# Altium footprint library EG4S20BG256.PcbLib: 33 footprints (part 1 of 3)
Each footprint in its own frame and in the unit in brackets; x right, y up, seen from the top. Pads: shape width x height; smd on the part's side, far side on the other; paste and mask are expansions set on the pad; w line width, h text height; cw(c..) or ccw(c..) is an arc to the next point about the centre after c.
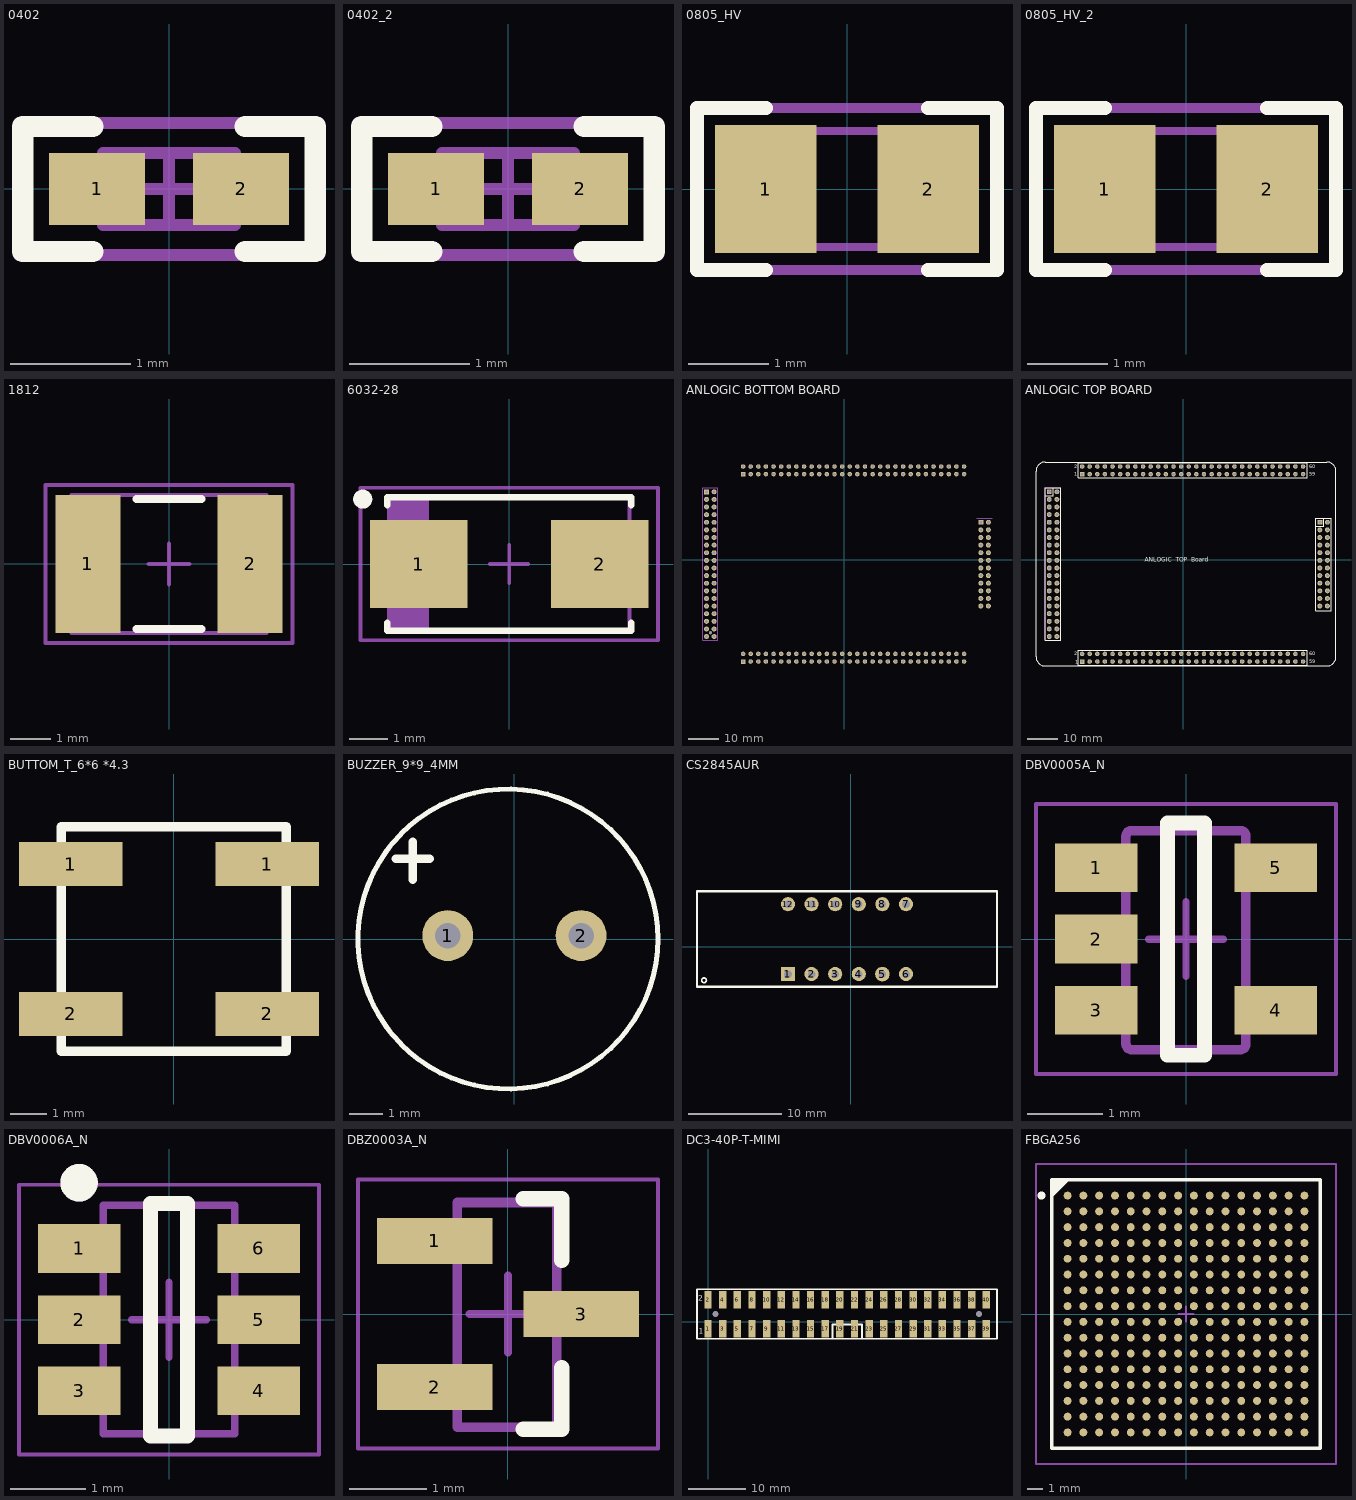
[diagram p0: the footprints below, top view; thin cyan lines are the x and y axes]

## 0402 [mm] "0402 from SM-752 data"
height 0.6
pads (2):
  rect 0.8x0.6 smd: 1(-0.6,0) 2(0.6,0)
Top Overlay:
  lines w0.178: -0.635,-0.521 -1.219,-0.521 -1.219,0.521 -0.635,0.521 ; 0.635,-0.521 1.219,-0.521 1.219,0.521 0.635,0.521
Mechanical 5:
  lines w0.1: -1.25,-0.55 -1.25,0.55 1.25,0.55 1.25,-0.55 -1.25,-0.55
  text ".Designator" at -1.117,-0.305 h0.61
Mechanical 13:
  lines w0.1: -0.35,-0.3 -0.35,0.3 ; 0.35,-0.3 0.35,0.3 ; -0.55,-0.3 0.55,-0.3 0.55,0.3 -0.55,0.3 -0.55,-0.3
Mechanical 15:
  lines w0.1: -0.3,0 0.3,0 ; 0,-0.3 0,0.3 ; -1.25,-0.55 1.25,-0.55 1.25,0.55 -1.25,0.55 -1.25,-0.55
3D body: height 0.6, standoff 0, extent 0.351,-0.299 0.549,0.299
3D body: height 0.6, standoff 0, extent -0.349,-0.299 0.349,0.299
3D body: height 0.6, standoff 0, extent -0.549,-0.299 -0.351,0.299

## 0402_2 [mm]
pads (2):
  rect 0.8x0.6 smd: 1(-0.6,0) 2(0.6,0)
Top Overlay:
  lines w0.178: -0.635,-0.521 -1.219,-0.521 -1.219,0.521 -0.635,0.521 ; 0.635,-0.521 1.219,-0.521 1.219,0.521 0.635,0.521
Mechanical 5:
  lines w0.1: -1.25,-0.55 1.25,-0.55 1.25,0.55 -1.25,0.55 -1.25,-0.55
  text ".Designator" at -1.117,-0.305 h0.61
Mechanical 13:
  lines w0.1: -0.35,-0.3 -0.35,0.3 ; 0.35,-0.3 0.35,0.3 ; -0.55,-0.3 -0.55,0.3 0.55,0.3 0.55,-0.3 -0.55,-0.3
Mechanical 15:
  lines w0.1: -0.3,0 0.3,0 ; 0,-0.3 0,0.3 ; -1.25,-0.55 -1.25,0.55 1.25,0.55 1.25,-0.55 -1.25,-0.55
3D body: height 0.6, standoff 0, extent -0.549,-0.299 -0.351,0.299
3D body: height 0.6, standoff 0, extent -0.349,-0.299 0.349,0.299
3D body: height 0.6, standoff 0, extent 0.351,-0.299 0.549,0.299

## 0805_HV [mil] "0805 with 30mil clearance between pads"
height 43.31
pads (2):
  rect 50x63 smd: 1(-40,0) 2(40,0)
Top Overlay:
  lines w7: -40,-40 -74,-40 -74,0 -74,40 -40,40 ; 40,-40 74,-40 74,0 74,40 40,40
Mechanical 5:
  lines w5: -74,-40 74,-40 74,40 -74,40 -74,-40
  text ".Designator" at -64,-17 h35
Mechanical 13:
  lines w3.94: -25.59,-28.54 -25.59,28.54 ; 25.59,-28.54 25.59,28.54 ; -43.31,-28.54 -43.31,28.54 43.31,28.54 43.31,-28.54 -43.31,-28.54
3D body: height 43.31, standoff 0, extent 25.61,-28.52 43.29,28.52
3D body: height 43.31, standoff 0, extent -25.57,-28.52 25.57,28.52
3D body: height 43.31, standoff 0, extent -43.29,-28.52 -25.61,28.52

## 0805_HV_2 [mil]
pads (2):
  rect 50x63 smd: 1(-40,0) 2(40,0)
Top Overlay:
  lines w7: -40,-40 -74,-40 -74,0 -74,40 -40,40 ; 40,-40 74,-40 74,0 74,40 40,40
Mechanical 5:
  lines w5: -74,-40 -74,40 74,40 74,-40 -74,-40
  text ".Designator" at -64,-17 h35
Mechanical 13:
  lines w3.94: -25.59,-28.54 -25.59,28.54 ; 25.59,-28.54 25.59,28.54 ; -43.31,-28.54 43.31,-28.54 43.31,28.54 -43.31,28.54 -43.31,-28.54
3D body: height 43.31, standoff 0, extent -43.29,-28.52 -25.61,28.52
3D body: height 43.31, standoff 0, extent -25.57,-28.52 25.57,28.52
3D body: height 43.31, standoff 0, extent 25.61,-28.52 43.29,28.52

## 1812 [mm]
height 1.35
pads (2):
  rect 1.6x3.4 smd: 1(-2,0) 2(2,0)
Top Overlay:
  lines w0.2: -0.8,-1.6 0.8,-1.6 ; -0.8,1.6 0.8,1.6
Mechanical 5:
  lines w0.1: -2.4,-1.7 -2.4,1.7 2.4,1.7 2.4,-1.7 -2.4,-1.7
  text ".Designator" at -1.875,-0.5 h1.02
Mechanical 13:
  lines w0.1: -1.9,-1.7 -1.9,1.7 ; 1.9,-1.7 1.9,1.7 ; -2.4,-1.7 2.4,-1.7 2.4,1.7 -2.4,1.7 -2.4,-1.7
Mechanical 15:
  lines w0.1: -0.5,0 0.5,0 ; 0,-0.5 0,0.5 ; -3.05,-1.95 3.05,-1.95 3.05,1.95 -3.05,1.95 -3.05,-1.95
3D body: height 1.35, standoff 0, extent 1.901,-1.699 2.399,1.699
3D body: height 1.35, standoff 0, extent -1.899,-1.699 1.899,1.699
3D body: height 1.35, standoff 0, extent -2.399,-1.699 -1.901,1.699

## 6032-28 [mm] "Medium Density IPC based on Vishay Sprague 293D datasheet."
height 2.8
pads (2):
  rect 2.55x2.3 smd: 1(-2.375,0) 2(2.375,0)
Top Overlay:
  circle w0.25: c-3.839,1.7 r0.125
  lines w0.178: -3.2,-1.539 -3.2,-1.75 3.2,-1.75 3.2,-1.539 ; -3.2,1.539 -3.2,1.75 3.2,1.75 3.2,1.539
Mechanical 5:
  rectangle: -3.15,-1.75 -2.15,1.75
  lines w0.1: -2.15,-1.75 -2.15,1.75 ; -3.15,-1.75 3.15,-1.75 3.15,1.75 -3.15,1.75 -3.15,-1.75
  text ".Designator" at -1.85,-0.525 h1.02
Mechanical 15:
  lines w0.1: -0.5,0 0.5,0 ; 0,-0.5 0,0.5 ; -3.9,-2 -3.9,2 3.9,2 3.9,-2 -3.9,-2
3D body: height 2.8, standoff 2.8, extent -3.149,-1.749 -2.151,1.749
3D body: height 2.8, standoff 0, extent -3.15,-1.75 3.15,1.75

## ANLOGIC BOTTOM BOARD [mm]
pads (185):
  round 0.924 hole 1.023: 0(-44.576,-24.293)
  rect 1.5x1.5 hole 0.9: P1_1(-33.655,28.575) P4_1(-33.655,-33.884)
  round 1.5 hole 0.9: P1_2(-33.655,31.115) P1_3(-31.115,28.575) P1_4(-31.115,31.115) P1_5(-28.575,28.575) P1_6(-28.575,31.115) P1_7(-26.035,28.575) P1_8(-26.035,31.115) P1_9(-23.495,28.575) P1_10(-23.495,31.115) P1_11(-20.955,28.575) P1_12(-20.955,31.115) P1_13(-18.415,28.575) P1_14(-18.415,31.115) P1_15(-15.875,28.575) P1_16(-15.875,31.115) P1_17(-13.335,28.575) P1_18(-13.335,31.115) P1_19(-10.795,28.575) P1_20(-10.795,31.115) P1_21(-8.255,28.575) P1_22(-8.255,31.115) P1_23(-5.715,28.575) P1_24(-5.715,31.115) P1_25(-3.175,28.575) P1_26(-3.175,31.115) P1_27(-0.635,28.575) P1_28(-0.635,31.115) P1_29(1.905,28.575) P1_30(1.905,31.115) P1_31(4.445,28.575) P1_32(4.445,31.115) P1_33(6.985,28.575) P1_34(6.985,31.115) P1_35(9.525,28.575) P1_36(9.525,31.115) P1_37(12.065,28.575) P1_38(12.065,31.115) P1_39(14.605,28.575) P1_40(14.605,31.115) P1_41(17.145,28.575) P1_42(17.145,31.115) P1_43(19.685,28.575) P1_44(19.685,31.115) P1_45(22.225,28.575) P1_46(22.225,31.115) P1_47(24.765,28.575) P1_48(24.765,31.115) P1_49(27.305,28.575) P1_50(27.305,31.115) P1_51(29.845,28.575) P1_52(29.845,31.115) P1_53(32.385,28.575) P1_54(32.385,31.115) P1_55(34.925,28.575) P1_56(34.925,31.115) P1_57(37.465,28.575) P1_58(37.465,31.115) P1_59(40.005,28.575) P1_60(40.005,31.115) P4_2(-33.655,-31.344) P4_3(-31.115,-33.884) P4_4(-31.115,-31.344) P4_5(-28.575,-33.884) P4_6(-28.575,-31.344) P4_7(-26.035,-33.884) P4_8(-26.035,-31.344) P4_9(-23.495,-33.884) P4_10(-23.495,-31.344) P4_11(-20.955,-33.884) P4_12(-20.955,-31.344) P4_13(-18.415,-33.884) P4_14(-18.415,-31.344) P4_15(-15.875,-33.884) P4_16(-15.875,-31.344) P4_17(-13.335,-33.884) P4_18(-13.335,-31.344) P4_19(-10.795,-33.884) P4_20(-10.795,-31.344) P4_21(-8.255,-33.884) P4_22(-8.255,-31.344) P4_23(-5.715,-33.884) P4_24(-5.715,-31.344) P4_25(-3.175,-33.884) P4_26(-3.175,-31.344) P4_27(-0.635,-33.884) P4_28(-0.635,-31.344) P4_29(1.905,-33.884) P4_30(1.905,-31.344) P4_31(4.445,-33.884) P4_32(4.445,-31.344) P4_33(6.985,-33.884) P4_34(6.985,-31.344) P4_35(9.525,-33.884) P4_36(9.525,-31.344) P4_37(12.065,-33.884) P4_38(12.065,-31.344) P4_39(14.605,-33.884) P4_40(14.605,-31.344) P4_41(17.145,-33.884) P4_42(17.145,-31.344) P4_43(19.685,-33.884) P4_44(19.685,-31.344) P4_45(22.225,-33.884) P4_46(22.225,-31.344) P4_47(24.765,-33.884) P4_48(24.765,-31.344) P4_49(27.305,-33.884) P4_50(27.305,-31.344) P4_51(29.845,-33.884) P4_52(29.845,-31.344) P4_53(32.385,-33.884) P4_54(32.385,-31.344) P4_55(34.925,-33.884) P4_56(34.925,-31.344) P4_57(37.465,-33.884) P4_58(37.465,-31.344) P4_59(40.005,-33.884) P4_60(40.005,-31.344)
  rect 1.65x1.65 hole 1.016 mask+0: P2_1(-45.836,22.687) P5_1(45.592,12.537)
  round 1.65 hole 1.016 mask+0: P2_2(-43.296,22.687) P2_3(-45.836,20.147) P2_4(-43.296,20.147) P2_5(-45.836,17.607) P2_6(-43.296,17.607) P2_7(-45.836,15.067) P2_8(-43.296,15.067) P2_9(-45.836,12.527) P2_10(-43.296,12.527) P2_11(-45.836,9.987) P2_12(-43.296,9.987) P2_13(-45.836,7.447) P2_14(-43.296,7.447) P2_15(-45.836,4.907) P2_16(-43.296,4.907) P2_17(-45.836,2.367) P2_18(-43.296,2.367) P2_19(-45.836,-0.173) P2_20(-43.296,-0.173) P2_21(-45.836,-2.713) P2_22(-43.296,-2.713) P2_23(-45.836,-5.253) P2_24(-43.296,-5.253) P2_25(-45.836,-7.793) P2_26(-43.296,-7.793) P2_27(-45.836,-10.333) P2_28(-43.296,-10.333) P2_29(-45.836,-12.873) P2_30(-43.296,-12.873) P2_31(-45.836,-15.413) P2_32(-43.296,-15.413) P2_33(-45.836,-17.953) P2_34(-43.296,-17.953) P2_35(-45.836,-20.493) P2_36(-43.296,-20.493) P2_37(-45.836,-23.033) P2_38(-43.296,-23.033) P2_39(-45.836,-25.573) P2_40(-43.296,-25.573) P5_2(48.132,12.537) P5_3(45.592,9.997) P5_4(48.132,9.997) P5_5(45.592,7.457) P5_6(48.132,7.457) P5_7(45.592,4.917) P5_8(48.132,4.917) P5_9(45.592,2.377) P5_10(48.132,2.377) P5_11(45.592,-0.163) P5_12(48.132,-0.163) P5_13(45.592,-2.703) P5_14(48.132,-2.703) P5_15(45.592,-5.243) P5_16(48.132,-5.243) P5_17(45.592,-7.783) P5_18(48.132,-7.783) P5_19(45.592,-10.323) P5_20(48.132,-10.323) P5_21(45.592,-12.863) P5_22(48.132,-12.863) P5_23(45.592,-15.403) P5_24(48.132,-15.403)
Bottom Overlay:
  lines w0.178: -47.106,21.417 -44.566,21.417 -44.566,23.957 ; 44.322,11.267 46.862,11.267 46.862,13.807 ; -47.106,-26.843 -42.026,-26.843 -42.026,23.957 -47.106,23.957 -47.106,-26.843 ; 44.322,-16.891 49.402,-16.891 49.402,13.807 44.322,13.807 44.322,-16.891
  lines w0.2: -34.925,-35.154 41.405,-35.154 41.405,-30.074 -34.925,-30.074 -34.925,-35.154 ; -34.925,27.305 41.405,27.305 41.405,32.385 -34.925,32.385 -34.925,27.305
  lines w0.254: 50.982,-32.365 50.982,29.625 ; 50.991,-32.373 cw(c47.986,-32.377) 47.991,-35.382 -46.012,-35.382 cw(c-46.012,-32.382) -49.012,-32.382 -49.012,29.617 cw(c-46.003,29.608) -45.995,32.617 47.974,32.617 cw(c47.986,29.613) 50.991,29.625
  text "ANLOGIC  TOP  Board" at 18.136,-1.194 h2.54
  text "60" at 44.171,30.429 h1.27
  text "59" at 44.298,-34.468 h1.27
  text "59" at 44.171,27.889 h1.27
  text "60" at 44.247,-31.979 h1.27
  text "2" at -35.814,30.404 h1.27
  text "1" at -36.322,-34.519 h1.27
  text "1" at -36.195,27.864 h1.27
  text "2" at -35.738,-31.725 h1.27
  text "1" at -34.061,27.889 h1.27
Mechanical 5:
  region: -46.344,23.195 -46.344,22.179 -45.328,22.179 -45.328,23.195
  region: 45.084,13.045 45.084,12.029 46.1,12.029 46.1,13.045
  lines w0.127: 44.322,13.807 49.402,13.807 ; -47.106,-26.843 -42.026,-26.843 -42.026,23.957 -47.106,23.957 -47.106,-26.843

## ANLOGIC TOP BOARD [mm]
pads (184):
  rect 1.5x1.5 hole 0.9: P1_1(-33.655,28.575) P4_1(-33.655,-33.884)
  round 1.5 hole 0.9: P1_2(-33.655,31.115) P1_3(-31.115,28.575) P1_4(-31.115,31.115) P1_5(-28.575,28.575) P1_6(-28.575,31.115) P1_7(-26.035,28.575) P1_8(-26.035,31.115) P1_9(-23.495,28.575) P1_10(-23.495,31.115) P1_11(-20.955,28.575) P1_12(-20.955,31.115) P1_13(-18.415,28.575) P1_14(-18.415,31.115) P1_15(-15.875,28.575) P1_16(-15.875,31.115) P1_17(-13.335,28.575) P1_18(-13.335,31.115) P1_19(-10.795,28.575) P1_20(-10.795,31.115) P1_21(-8.255,28.575) P1_22(-8.255,31.115) P1_23(-5.715,28.575) P1_24(-5.715,31.115) P1_25(-3.175,28.575) P1_26(-3.175,31.115) P1_27(-0.635,28.575) P1_28(-0.635,31.115) P1_29(1.905,28.575) P1_30(1.905,31.115) P1_31(4.445,28.575) P1_32(4.445,31.115) P1_33(6.985,28.575) P1_34(6.985,31.115) P1_35(9.525,28.575) P1_36(9.525,31.115) P1_37(12.065,28.575) P1_38(12.065,31.115) P1_39(14.605,28.575) P1_40(14.605,31.115) P1_41(17.145,28.575) P1_42(17.145,31.115) P1_43(19.685,28.575) P1_44(19.685,31.115) P1_45(22.225,28.575) P1_46(22.225,31.115) P1_47(24.765,28.575) P1_48(24.765,31.115) P1_49(27.305,28.575) P1_50(27.305,31.115) P1_51(29.845,28.575) P1_52(29.845,31.115) P1_53(32.385,28.575) P1_54(32.385,31.115) P1_55(34.925,28.575) P1_56(34.925,31.115) P1_57(37.465,28.575) P1_58(37.465,31.115) P1_59(40.005,28.575) P1_60(40.005,31.115) P4_2(-33.655,-31.344) P4_3(-31.115,-33.884) P4_4(-31.115,-31.344) P4_5(-28.575,-33.884) P4_6(-28.575,-31.344) P4_7(-26.035,-33.884) P4_8(-26.035,-31.344) P4_9(-23.495,-33.884) P4_10(-23.495,-31.344) P4_11(-20.955,-33.884) P4_12(-20.955,-31.344) P4_13(-18.415,-33.884) P4_14(-18.415,-31.344) P4_15(-15.875,-33.884) P4_16(-15.875,-31.344) P4_17(-13.335,-33.884) P4_18(-13.335,-31.344) P4_19(-10.795,-33.884) P4_20(-10.795,-31.344) P4_21(-8.255,-33.884) P4_22(-8.255,-31.344) P4_23(-5.715,-33.884) P4_24(-5.715,-31.344) P4_25(-3.175,-33.884) P4_26(-3.175,-31.344) P4_27(-0.635,-33.884) P4_28(-0.635,-31.344) P4_29(1.905,-33.884) P4_30(1.905,-31.344) P4_31(4.445,-33.884) P4_32(4.445,-31.344) P4_33(6.985,-33.884) P4_34(6.985,-31.344) P4_35(9.525,-33.884) P4_36(9.525,-31.344) P4_37(12.065,-33.884) P4_38(12.065,-31.344) P4_39(14.605,-33.884) P4_40(14.605,-31.344) P4_41(17.145,-33.884) P4_42(17.145,-31.344) P4_43(19.685,-33.884) P4_44(19.685,-31.344) P4_45(22.225,-33.884) P4_46(22.225,-31.344) P4_47(24.765,-33.884) P4_48(24.765,-31.344) P4_49(27.305,-33.884) P4_50(27.305,-31.344) P4_51(29.845,-33.884) P4_52(29.845,-31.344) P4_53(32.385,-33.884) P4_54(32.385,-31.344) P4_55(34.925,-33.884) P4_56(34.925,-31.344) P4_57(37.465,-33.884) P4_58(37.465,-31.344) P4_59(40.005,-33.884) P4_60(40.005,-31.344)
  rect 1.65x1.65 hole 1.016 mask+0: P2_1(-44.592,22.697) P5_1(45.592,12.537)
  round 1.65 hole 1.016 mask+0: P2_2(-42.052,22.697) P2_3(-44.592,20.157) P2_4(-42.052,20.157) P2_5(-44.592,17.617) P2_6(-42.052,17.617) P2_7(-44.592,15.077) P2_8(-42.052,15.077) P2_9(-44.592,12.537) P2_10(-42.052,12.537) P2_11(-44.592,9.997) P2_12(-42.052,9.997) P2_13(-44.592,7.457) P2_14(-42.052,7.457) P2_15(-44.592,4.917) P2_16(-42.052,4.917) P2_17(-44.592,2.377) P2_18(-42.052,2.377) P2_19(-44.592,-0.163) P2_20(-42.052,-0.163) P2_21(-44.592,-2.703) P2_22(-42.052,-2.703) P2_23(-44.592,-5.243) P2_24(-42.052,-5.243) P2_25(-44.592,-7.783) P2_26(-42.052,-7.783) P2_27(-44.592,-10.323) P2_28(-42.052,-10.323) P2_29(-44.592,-12.863) P2_30(-42.052,-12.863) P2_31(-44.592,-15.403) P2_32(-42.052,-15.403) P2_33(-44.592,-17.943) P2_34(-42.052,-17.943) P2_35(-44.592,-20.483) P2_36(-42.052,-20.483) P2_37(-44.592,-23.023) P2_38(-42.052,-23.023) P2_39(-44.592,-25.563) P2_40(-42.052,-25.563) P5_2(48.132,12.537) P5_3(45.592,9.997) P5_4(48.132,9.997) P5_5(45.592,7.457) P5_6(48.132,7.457) P5_7(45.592,4.917) P5_8(48.132,4.917) P5_9(45.592,2.377) P5_10(48.132,2.377) P5_11(45.592,-0.163) P5_12(48.132,-0.163) P5_13(45.592,-2.703) P5_14(48.132,-2.703) P5_15(45.592,-5.243) P5_16(48.132,-5.243) P5_17(45.592,-7.783) P5_18(48.132,-7.783) P5_19(45.592,-10.323) P5_20(48.132,-10.323) P5_21(45.592,-12.863) P5_22(48.132,-12.863) P5_23(45.592,-15.403) P5_24(48.132,-15.403)
Top Overlay:
  lines w0.178: -45.862,21.427 -43.322,21.427 -43.322,23.967 ; 44.322,11.267 46.862,11.267 46.862,13.807 ; -45.862,-26.833 -40.782,-26.833 -40.782,23.967 -45.862,23.967 -45.862,-26.833 ; 44.322,-16.891 49.402,-16.891 49.402,13.807 44.322,13.807 44.322,-16.891
  lines w0.2: -34.925,-35.154 -34.925,-30.074 41.405,-30.074 41.405,-35.154 -34.925,-35.154 ; -34.925,27.305 41.405,27.305 41.405,32.385 -34.925,32.385 -34.925,27.305
  lines w0.254: 50.982,-32.365 50.982,29.625 ; 50.991,-32.373 cw(c47.986,-32.377) 47.991,-35.382 -46.012,-35.382 cw(c-46.012,-32.382) -49.012,-32.382 -49.012,29.617 cw(c-46.003,29.608) -45.995,32.617 47.974,32.617 cw(c47.986,29.613) 50.991,29.625
  text "ANLOGIC  TOP  Board" at -12.7,-1.092 h2.54
  text "2" at -36.32,-31.854 h1.27
  text "1" at -35.982,-34.633 h1.27
  text "59" at 42.037,-34.392 h1.27
  text "60" at 42.037,-31.852 h1.27
  text "60" at 42.037,30.607 h1.27
  text "59" at 42.037,28.067 h1.27
  text "1" at -36.195,28.067 h1.27
  text "2" at -36.195,30.607 h1.27
Bottom Overlay:
  lines w0.3: -41.512,-3.983 -41.512,1.097
  text "1" at -36.195,28.067 h1.27
Mechanical 5:
  region: -45.1,23.205 -45.1,22.189 -44.084,22.189 -44.084,23.205
  region: 45.084,13.045 45.084,12.029 46.1,12.029 46.1,13.045
  lines w0.127: 44.322,13.807 49.402,13.807 ; -45.862,-26.833 -45.862,23.967 -40.782,23.967 -40.782,-26.833 -45.862,-26.833

## BUTTOM_T_6*6 *4.3 [mm]
height 5.563
pads (4):
  rect 2.8x1.2 smd: 1(-2.794,2.032) 1(2.54,2.032) 2(-2.794,-2.032) 2(2.54,-2.032)
Top Overlay:
  lines w0.254: -3.048,-3.048 3.048,-3.048 3.048,3.048 -3.048,3.048 -3.048,0.254 -3.048,-3.048

## BUZZER_9*9_4MM [mil]
height 71
pads (2):
  round 60 hole 30: 1(-78.74,4.05) 2(78.74,4.05)
Top Overlay:
  circle w5.91: c-7.6,0 r177.17
  lines w10: -140,95 -100,95 ; -120,70 -120,115

## CS2845AUR [mil] "4位数码管"
height 219
pads (12):
  rect 60x60 hole 32: 1(-265,-116.06)
  round 60 hole 32: 2(-165,-116.06) 3(-65,-116.06) 4(35,-116.06) 6(235,-116.06) 7(235,180) 8(135,180) 9(35,180) 10(-65,180) 11(-165,180) 12(-265,180)
  round 62 hole 32: 5(135,-116.06)
Top Overlay:
  circle w7: c-620.47,-142.52 r10
  lines w10: -650.39,-170 -650.39,235 620.47,235 620.47,-170 -650.39,-170

## DBV0005A_N [mm] "SOT23, 5-Leads, Body 2.9x1.6mm, Pitch 0.95mm, Lead Span 2.8mm, IPC Medium Density"
height 1.45
pads (5):
  rect 1.1x0.65 smd: 1(-1.2,0.95) 2(-1.2,0) 3(-1.2,-0.95) 4(1.2,-0.95) 5(1.2,0.95)
Top Overlay:
  lines w0.2: -0.25,-1.55 -0.25,1.55 0.25,1.55 0.25,-1.55 -0.25,-1.55
Mechanical 5:
  lines w0.127: -0.801,1.371 cw(c-0.725,1.37) -0.725,1.446 ; -0.801,1.37 -0.801,1.371 ; -0.801,1.37 -0.801,-1.399 -0.801,-1.4 ccw(c-0.725,-1.399) -0.725,-1.475 ; -0.725,-1.475 0.723,-1.475 0.724,-1.475 ccw(c0.723,-1.399) 0.799,-1.4 0.799,-1.399 0.799,1.37 ; -0.725,-1.475 -0.725,-1.475 ; -0.725,1.446 -0.725,1.446 ; -0.725,1.446 0.723,1.446 0.724,1.446 cw(c0.723,1.37) 0.799,1.371 ; 0.799,1.37 0.799,1.371 ; -1.423,-1.167 -1.423,-0.767 -1.199,-0.767 -1.105,-0.767 -1.088,-0.767 -0.835,-0.767 -0.801,-0.767 -0.801,-1.167 -0.835,-1.167 -1.088,-1.167 -1.105,-1.167 -1.199,-1.167 -1.423,-1.167 ; -1.423,-0.215 -1.423,0.186 -1.199,0.186 -1.105,0.186 -1.088,0.186 -0.835,0.186 -0.801,0.186 -0.801,-0.215 -0.835,-0.215 -1.088,-0.215 -1.105,-0.215 -1.199,-0.215 -1.423,-0.215 ; -1.423,0.738 -1.423,1.138 -1.199,1.138 -1.105,1.138 -1.088,1.138 -0.835,1.138 -0.801,1.138 -0.801,0.738 -0.835,0.738 -1.088,0.738 -1.105,0.738 -1.199,0.738 -1.423,0.738 ; 0.799,-1.167 0.834,-1.167 1.087,-1.167 1.103,-1.167 1.198,-1.167 1.422,-1.167 1.422,-0.767 1.198,-0.767 1.103,-0.767 1.087,-0.767 0.834,-0.767 0.799,-0.767 0.799,-1.167 ; 0.799,0.738 0.834,0.738 1.087,0.738 1.103,0.738 1.198,0.738 1.422,0.738 1.422,1.138 1.198,1.138 1.103,1.138 1.087,1.138 0.834,1.138 0.799,1.138 0.799,0.738
  text ".Designator" at -0.25,0.95 h0.51
Mechanical 15:
  lines w0.05: -2,-1.8 2,-1.8 2,1.8 -2,1.8 -2,-1.8
  lines w0.1: -0.5,0 0.5,0 ; 0,-0.5 0,0.5
3D body "DBV0005AaksMF05A.stp": height 1.08, standoff -0.01, extent -1.422,-1.461 1.422,1.46

## DBV0006A_N [mm] "SOT23, 6-Leads, Body 2.9x1.6mm, Pitch 0.95mm, Lead Span 2.8mm, IPC Medium Density"
height 1.45
pads (6):
  rect 1.1x0.65 smd: 1(-1.2,0.95) 2(-1.2,0) 3(-1.2,-0.95) 4(1.2,-0.95) 5(1.2,0) 6(1.2,0.95)
Top Overlay:
  circle w0.25: c-1.2,1.825 r0.125
  lines w0.2: -0.25,-1.55 0.25,-1.55 0.25,1.55 -0.25,1.55 -0.25,-1.55
Mechanical 5:
  circle w0.25: c-1.2,1.825 r0.125
  lines w0.1: -0.875,-1.525 -0.875,1.525 0.875,1.525 0.875,-1.525 -0.875,-1.525
  text ".Designator" at -0.254,1.27 h0.51
Mechanical 15:
  lines w0.05: -2,-1.8 -2,1.8 2,1.8 2,-1.8 -2,-1.8
  lines w0.1: -0.5,0 0.5,0 ; 0,-0.5 0,0.5
3D body: height 1.45, standoff 0, extent -0.875,-1.525 0.875,1.525

## DBZ0003A_N [mm] "SOT23, 3-Leads, Body 2.9x1.3mm, Pitch 0.95mm, Lead Span 2.4mm, IPC Medium Density"
height 1.12
pads (3):
  rect 1.5x0.6 smd: 1(-0.95,0.95) 2(-0.95,-0.95) 3(0.95,0)
Top Overlay:
  lines w0.2: 0.2,-1.5 0.7,-1.5 0.7,-0.7 ; 0.2,1.5 0.7,1.5 0.7,0.7
Mechanical 5:
  lines w0.127: -1.27,-1.187 -1.27,-0.743 -1.063,-0.743 -1.005,-0.743 -0.814,-0.743 -0.66,-0.743 -0.66,-1.187 -0.814,-1.187 -1.005,-1.187 -1.063,-1.187 -1.27,-1.187 ; -1.27,0.718 -1.27,1.162 -1.063,1.162 -1.005,1.162 -0.814,1.162 -0.66,1.162 -0.66,0.718 -0.814,0.718 -1.005,0.718 -1.063,0.718 -1.27,0.718 ; -0.66,-1.473 -0.66,1.448 0.635,1.448 0.635,-1.473 -0.66,-1.473 ; 0.635,-0.235 0.789,-0.235 0.98,-0.235 1.037,-0.235 1.245,-0.235 1.245,0.21 1.037,0.21 0.98,0.21 0.789,0.21 0.635,0.21 0.635,-0.235
  text ".Designator" at -0.254,0.889 h0.51
Mechanical 15:
  lines w0.05: -1.95,-1.75 -1.95,1.75 1.95,1.75 1.95,-1.75 -1.95,-1.75
  lines w0.1: -0.5,0 0.5,0 ; 0,-0.5 0,0.5
3D body "DBZ0003AakaMF03A.stp": height 0.96, standoff -0.02, extent -1.257,-1.46 1.257,1.46

## DC3-40P-T-MIMI [mil] "Connector; Header; 20x2 Position"
pads (42):
  round 36.37 hole 40.28: 0(50,51.57) 0(1850,51.57)
  rect 50x120 smd: 1(0,-47.87) 2(0,150) 3(100,-47.87) 4(100,150) 5(200,-47.87) 6(200,150) 7(300,-47.87) 8(300,150) 9(400,-47.87) 10(400,150) 11(500,-47.87) 12(500,150) 13(600,-47.87) 14(600,150) 15(700,-47.87) 16(700,150) 17(800,-47.87) 18(800,150) 19(900,-47.87) 20(900,150) 21(1000,-47.87) 22(1000,150) 23(1100,-47.87) 24(1100,150) 25(1200,-47.87) 26(1200,150) 27(1300,-47.87) 28(1300,150) 29(1400,-47.87) 30(1400,150) 31(1500,-47.87) 32(1500,150) 33(1600,-47.87) 34(1600,150) 35(1700,-47.87) 36(1700,150) 37(1800,-47.87) 38(1800,150) 39(1900,-47.87) 40(1900,150)
Top Overlay:
  lines w11.81: 850.39,-117.32 850.39,-19.68 1050.39,-19.68 1050.39,-117.32 ; -75.59,-117.32 1972.83,-117.32 1972.83,220.87 -75.59,220.87 -75.59,-117.32
  text "2" at -65.75,129.92 h65
  text "1" at -62.99,-97.64 h65

## FBGA256 [mm] "256-Ball FineLine Ball Grid Array (FBGA256) - Option 1"
height 2.2
pads (256):
  round 0.5 smd: A1(-7.5,7.5) A2(-6.5,7.5) A3(-5.5,7.5) A4(-4.5,7.5) A5(-3.5,7.5) A6(-2.5,7.5) A7(-1.5,7.5) A8(-0.5,7.5) A9(0.5,7.5) A10(1.5,7.5) A11(2.5,7.5) A12(3.5,7.5) A13(4.5,7.5) A14(5.5,7.5) A15(6.5,7.5) A16(7.5,7.5) B1(-7.5,6.5) B2(-6.5,6.5) B3(-5.5,6.5) B4(-4.5,6.5) B5(-3.5,6.5) B6(-2.5,6.5) B7(-1.5,6.5) B8(-0.5,6.5) B9(0.5,6.5) B10(1.5,6.5) B11(2.5,6.5) B12(3.5,6.5) B13(4.5,6.5) B14(5.5,6.5) B15(6.5,6.5) B16(7.5,6.5) C1(-7.5,5.5) C2(-6.5,5.5) C3(-5.5,5.5) C4(-4.5,5.5) C5(-3.5,5.5) C6(-2.5,5.5) C7(-1.5,5.5) C8(-0.5,5.5) C9(0.5,5.5) C10(1.5,5.5) C11(2.5,5.5) C12(3.5,5.5) C13(4.5,5.5) C14(5.5,5.5) C15(6.5,5.5) C16(7.5,5.5) D1(-7.5,4.5) D2(-6.5,4.5) D3(-5.5,4.5) D4(-4.5,4.5) D5(-3.5,4.5) D6(-2.5,4.5) D7(-1.5,4.5) D8(-0.5,4.5) D9(0.5,4.5) D10(1.5,4.5) D11(2.5,4.5) D12(3.5,4.5) D13(4.5,4.5) D14(5.5,4.5) D15(6.5,4.5) D16(7.5,4.5) E1(-7.5,3.5) E2(-6.5,3.5) E3(-5.5,3.5) E4(-4.5,3.5) E5(-3.5,3.5) E6(-2.5,3.5) E7(-1.5,3.5) E8(-0.5,3.5) E9(0.5,3.5) E10(1.5,3.5) E11(2.5,3.5) E12(3.5,3.5) E13(4.5,3.5) E14(5.5,3.5) E15(6.5,3.5) E16(7.5,3.5) F1(-7.5,2.5) F2(-6.5,2.5) F3(-5.5,2.5) F4(-4.5,2.5) F5(-3.5,2.5) F6(-2.5,2.5) F7(-1.5,2.5) F8(-0.5,2.5) F9(0.5,2.5) F10(1.5,2.5) F11(2.5,2.5) F12(3.5,2.5) F13(4.5,2.5) F14(5.5,2.5) F15(6.5,2.5) F16(7.5,2.5) G1(-7.5,1.5) G2(-6.5,1.5) G3(-5.5,1.5) G4(-4.5,1.5) G5(-3.5,1.5) G6(-2.5,1.5) G7(-1.5,1.5) G8(-0.5,1.5) G9(0.5,1.5) G10(1.5,1.5) G11(2.5,1.5) G12(3.5,1.5) G13(4.5,1.5) G14(5.5,1.5) G15(6.5,1.5) G16(7.5,1.5) H1(-7.5,0.5) H2(-6.5,0.5) H3(-5.5,0.5) H4(-4.5,0.5) H5(-3.5,0.5) H6(-2.5,0.5) H7(-1.5,0.5) H8(-0.5,0.5) H9(0.5,0.5) H10(1.5,0.5) H11(2.5,0.5) H12(3.5,0.5) H13(4.5,0.5) H14(5.5,0.5) H15(6.5,0.5) H16(7.5,0.5) J1(-7.5,-0.5) J2(-6.5,-0.5) J3(-5.5,-0.5) J4(-4.5,-0.5) J5(-3.5,-0.5) J6(-2.5,-0.5) J7(-1.5,-0.5) J8(-0.5,-0.5) J9(0.5,-0.5) J10(1.5,-0.5) J11(2.5,-0.5) J12(3.5,-0.5) J13(4.5,-0.5) J14(5.5,-0.5) J15(6.5,-0.5) J16(7.5,-0.5) K1(-7.5,-1.5) K2(-6.5,-1.5) K3(-5.5,-1.5) K4(-4.5,-1.5) K5(-3.5,-1.5) K6(-2.5,-1.5) K7(-1.5,-1.5) K8(-0.5,-1.5) K9(0.5,-1.5) K10(1.5,-1.5) K11(2.5,-1.5) K12(3.5,-1.5) K13(4.5,-1.5) K14(5.5,-1.5) K15(6.5,-1.5) K16(7.5,-1.5) L1(-7.5,-2.5) L2(-6.5,-2.5) L3(-5.5,-2.5) L4(-4.5,-2.5) L5(-3.5,-2.5) L6(-2.5,-2.5) L7(-1.5,-2.5) L8(-0.5,-2.5) L9(0.5,-2.5) L10(1.5,-2.5) L11(2.5,-2.5) L12(3.5,-2.5) L13(4.5,-2.5) L14(5.5,-2.5) L15(6.5,-2.5) L16(7.5,-2.5) M1(-7.5,-3.5) M2(-6.5,-3.5) M3(-5.5,-3.5) M4(-4.5,-3.5) M5(-3.5,-3.5) M6(-2.5,-3.5) M7(-1.5,-3.5) M8(-0.5,-3.5) M9(0.5,-3.5) M10(1.5,-3.5) M11(2.5,-3.5) M12(3.5,-3.5) M13(4.5,-3.5) M14(5.5,-3.5) M15(6.5,-3.5) M16(7.5,-3.5) N1(-7.5,-4.5) N2(-6.5,-4.5) N3(-5.5,-4.5) N4(-4.5,-4.5) N5(-3.5,-4.5) N6(-2.5,-4.5) N7(-1.5,-4.5) N8(-0.5,-4.5) N9(0.5,-4.5) N10(1.5,-4.5) N11(2.5,-4.5) N12(3.5,-4.5) N13(4.5,-4.5) N14(5.5,-4.5) N15(6.5,-4.5) N16(7.5,-4.5) P1(-7.5,-5.5) P2(-6.5,-5.5) P3(-5.5,-5.5) P4(-4.5,-5.5) P5(-3.5,-5.5) P6(-2.5,-5.5) P7(-1.5,-5.5) P8(-0.5,-5.5) P9(0.5,-5.5) P10(1.5,-5.5) P11(2.5,-5.5) P12(3.5,-5.5) P13(4.5,-5.5) P14(5.5,-5.5) P15(6.5,-5.5) P16(7.5,-5.5) R1(-7.5,-6.5) R2(-6.5,-6.5) R3(-5.5,-6.5) R4(-4.5,-6.5) R5(-3.5,-6.5) R6(-2.5,-6.5) R7(-1.5,-6.5) R8(-0.5,-6.5) R9(0.5,-6.5) R10(1.5,-6.5) R11(2.5,-6.5) R12(3.5,-6.5) R13(4.5,-6.5) R14(5.5,-6.5) R15(6.5,-6.5) R16(7.5,-6.5) T1(-7.5,-7.5) T2(-6.5,-7.5) T3(-5.5,-7.5) T4(-4.5,-7.5) T5(-3.5,-7.5) T6(-2.5,-7.5) T7(-1.5,-7.5) T8(-0.5,-7.5) T9(0.5,-7.5) T10(1.5,-7.5) T11(2.5,-7.5) T12(3.5,-7.5) T13(4.5,-7.5) T14(5.5,-7.5) T15(6.5,-7.5) T16(7.5,-7.5)
Top Overlay:
  circle w0.25: c-9.15,7.5 r0.125
  region: -7.5,8.5 -8.5,7.5 -8.5,8.5
  lines w0.2: -8.5,7.5 -7.5,8.5 ; -8.5,-8.5 8.5,-8.5 8.5,8.5 -8.5,8.5 -8.5,-8.5
Mechanical 13:
  lines w0.1: -8.5,-8.5 8.5,-8.5 8.5,8.5 -8.5,8.5 -8.5,-8.5
Mechanical 15:
  lines w0.1: -0.5,0 0.5,0 ; 0,-0.5 0,0.5 ; -9.5,-9.5 9.5,-9.5 9.5,9.5 -9.5,9.5 -9.5,-9.5
3D body: height 2.2, standoff 0, extent -8.5,-8.5 8.5,8.5